# Altium footprint library soldeerstation.PcbLib: 91 footprints (part 4 of 6)
Each footprint in its own frame and in the unit in brackets; x right, y up, seen from the top. Pads: shape width x height; smd on the part's side, far side on the other; paste and mask are expansions set on the pad; w line width, h text height; cw(c..) or ccw(c..) is an arc to the next point about the centre after c.
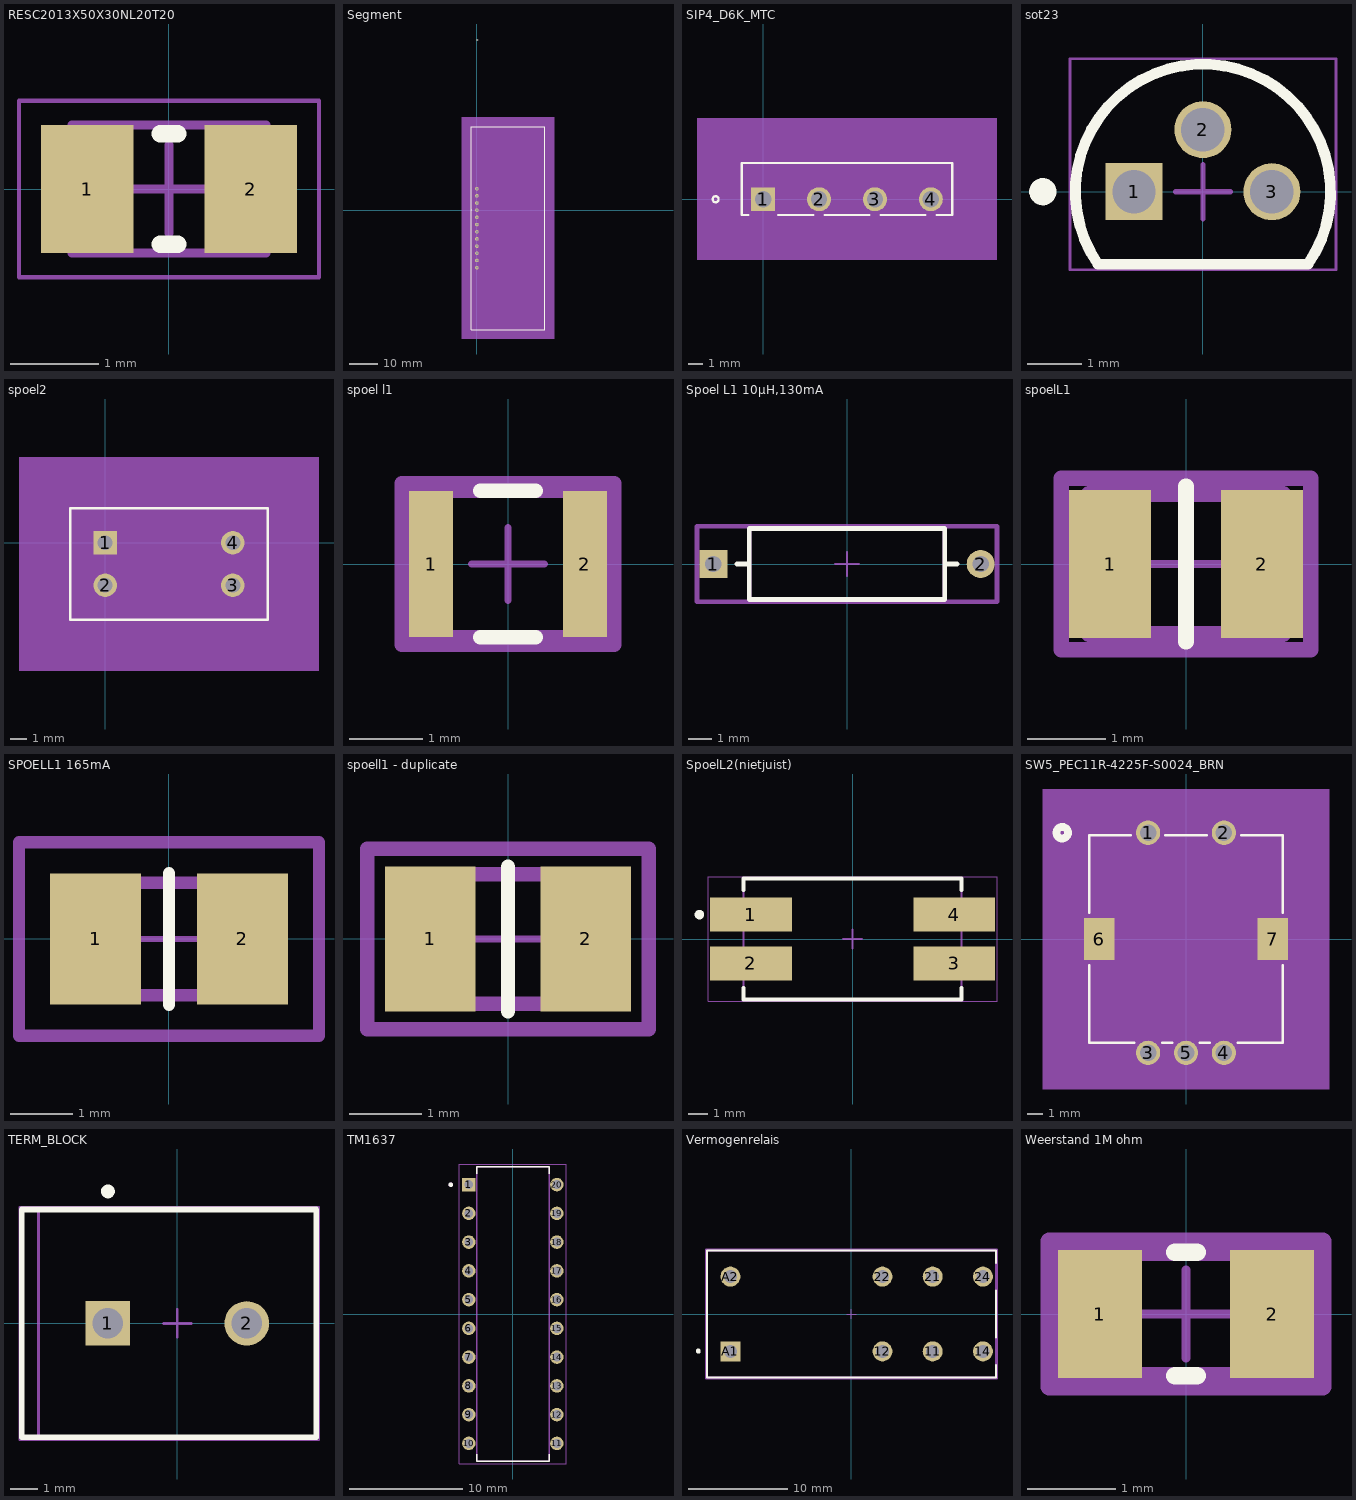
[diagram p3: the footprints below, top view; thin cyan lines are the x and y axes]

## RESC2013X50X30NL20T20 [mm] "Chip Resistor, 2-Leads, Body 2.00x1.25mm, IPC Medium Density"
height 0.5
pads (2):
  rect 1.05x1.45 smd: 1(-0.925,0) 2(0.925,0)
Top Overlay:
  lines w0.2: -0.1,-0.625 0.1,-0.625 ; -0.1,0.625 0.1,0.625
Mechanical 13:
  lines w0.1: -1.1,-0.725 -1.1,0.725 1.1,0.725 1.1,-0.725 -1.1,-0.725
Mechanical 15:
  lines w0.05: -1.7,-1 -1.7,1 1.7,1 1.7,-1 -1.7,-1
  lines w0.1: -0.5,0 0.5,0 ; 0,-0.5 0,0.5
3D body: height 0.5, standoff 0, extent -0.8,-0.725 0.8,0.725
3D body: height 0.5, standoff 0, extent -1.1,-0.725 -0.8,0.725
3D body: height 0.5, standoff 0, extent 0.8,-0.725 1.1,0.725

## Segment [mil]
pads (12):
  round 50 hole 30 mask+0: 1(0,0) 2(0,-100) 3(0,-200) 4(0,-300) 5(0,-400) 6(0,-500) 7(0,-800) 8(0,300) 9(0,-700) 10(0,200) 11(0,100) 12(0,-600)
Top Overlay:
  circle w6: c-79,0 r3
  lines w6: -77.93,-1664.55 -77.93,1164.45 944.07,1164.45 944.07,-1664.55 -77.93,-1664.55
  text "*" at -12.5,2335.56 h50
Top Assembly:
  region: 1074.07,-1794.55 -207.93,-1794.55 -207.93,1294.45 1074.07,1294.45
Mechanical 13:
  circle w0: c25,0 r3
  lines w0: 421.07,1159.45 ccw(c433.07,1159.45) 445.07,1159.45
  lines w1: -72.93,-1659.55 -72.93,1159.45 939.07,1159.45 939.07,-1659.55 -72.93,-1659.55
  text "*" at -12.5,16.67 h50
Mechanical 15:
  region: 939.07,-1659.55 -72.93,-1659.55 -72.93,1159.45 939.07,1159.45
  region: 949.07,-1669.55 -82.93,-1669.55 -82.93,1169.45 949.07,1169.45
  lines w6: -82.93,-1669.55 949.07,-1669.55 949.07,1169.45 -82.93,1169.45 -82.93,-1669.55
3D body "COM-11408_SPK.step": height 335.12, standoff -100, extent -72.91,-1659.57 939.06,1159.45

## SIP4_D6K_MTC [mil]
pads (4):
  rect 64x64 hole 44 mask+0: 1(0,0)
  round 64 hole 44 mask+0: 2(150,0) 3(300,0) 4(450,0)
Top Overlay:
  circle w6: c-127.5,0 r8
  lines w6: -39.86,-42.48 -57.5,-42.48 -57.5,97.52 507.5,97.52 507.5,-42.48 465.15,-42.48 ; 39.86,-42.48 134.85,-42.48 ; 165.15,-42.48 284.85,-42.48 ; 315.15,-42.48 434.85,-42.48
Top Assembly:
  region: -177.5,217.52 627.5,217.52 627.5,-162.48 -177.5,-162.48
Mechanical 13:
  circle w0: c-42.5,-27.48 r8
  lines w1: -52.5,-37.48 502.5,-37.48 502.5,92.52 -52.5,92.52 -52.5,-37.48
Mechanical 15:
  region: 512.5,102.52 -62.5,102.52 -62.5,-47.48 512.5,-47.48
  lines w6: -62.5,-47.48 -62.5,102.52 512.5,102.52 512.5,-47.48 -62.5,-47.48
3D body "SIP4_D6K_MTC.step": height 484.02, standoff -235.98, extent -52.52,-37.48 502.48,92.52

## sot23 [mm] "TO, 3-Leads, Body Dia 4.7mm, Pitch 1.27mm"
height 7.87
pads (3):
  rect 1.05x1.05 hole 0.8: 1(-1.27,0)
  round 1.05 hole 0.8: 2(0,1.143) 3(1.27,0)
Top Overlay:
  circle w0.25: c-2.95,0 r0.125
  lines w0.2: -1.934,-1.335 cw(c0,0) 1.934,-1.335 -1.934,-1.335
Mechanical 13:
  lines w0.1: -1.934,-1.335 cw(c0,0) 1.934,-1.335 -1.934,-1.335
Mechanical 15:
  lines w0.05: -2.45,-1.435 2.45,-1.435 2.45,2.45 -2.45,2.45 -2.45,-1.435
  lines w0.1: -0.5,0 0.5,0 ; 0,-0.5 0,0.5
3D body: height 7.87, standoff 2.54, extent -2.349,-1.334 2.357,2.359

## spoel2 [mil]
pads (4):
  rect 55x55 hole 35 mask+0: 1(0,0)
  round 55 hole 35 mask+0: 2(0,-100) 3(300,-100) 4(300,0)
Top Overlay:
  lines w6: -82.5,-181 -82.5,81 382.5,81 382.5,-181 -82.5,-181
Top Assembly:
  region: 502.5,-301 -202.5,-301 -202.5,201 502.5,201
Mechanical 13:
  lines w1: -77.5,-176 -77.5,76 377.5,76 377.5,-176 -77.5,-176
Mechanical 15:
  region: 387.5,-186 -87.5,-186 -87.5,86 387.5,86
  lines w6: -87.5,-186 387.5,-186 387.5,86 -87.5,86 -87.5,-186
3D body: height 10, standoff 0, extent 0,0 10,10

## spoel l1 [mm]
pads (2):
  rect 0.6x2 smd paste+0 mask+0: 1(-1.05,0) 2(1.05,0)
Top Overlay:
  lines w0.2: -0.375,-1 0.375,-1 ; -0.375,1 0.375,1
Top 3D Body:
  lines w0.2: -1.35,-1 -1.35,1 1.35,1 1.35,-1 -1.35,-1
Top Courtyard:
  lines w0.2: -1.45,-1.1 -1.45,1.1 1.45,1.1 1.45,-1.1 -1.45,-1.1
Top Assembly:
  lines w0.2: -1.45,-1.1 -1.45,1.1 1.45,1.1 1.45,-1.1 -1.45,-1.1
  text ".Designator" at 0,0.187 h1
Top Component Center:
  lines w0.1: -0.5,0 0.5,0 ; 0,-0.5 0,0.5
3D body "Ind_Taiyo_Yuden_LB2518T1R0M_eec.STEP": height 0.25, standoff 0, extent -1.45,-1.1 1.45,1.1

## Spoel L1 10µH,130mA [mm]
pads (2):
  rect 1.2x1.2 hole 0.7 paste-1000 mask+0: 1(-5.736,0)
  round 1.2 hole 0.7 paste-1000 mask+0: 2(5.736,0)
Top Overlay:
  lines w0.2: -4.736,0 -4.19,0 ; 4.19,0 4.736,0 ; -4.19,-1.525 4.19,-1.525 4.19,1.525 -4.19,1.525 -4.19,-1.525
Top 3D Body:
  lines w0.2: -4.19,-1.525 4.19,-1.525 4.19,1.525 -4.19,1.525 -4.19,-1.525
Top Courtyard:
  lines w0.2: -6.436,-1.625 6.436,-1.625 6.436,1.625 -6.436,1.625 -6.436,-1.625
Top Assembly:
  lines w0.2: -6.436,-1.625 6.436,-1.625 6.436,1.625 -6.436,1.625 -6.436,-1.625
  text ".Designator" at 0,0.187 h1
Top Component Center:
  lines w0.1: -0.5,0 0.5,0 ; 0,-0.5 0,0.5
3D body "Ind_Vishay_Dale_IR02BH100K_eec.STEP": height 0.25, standoff 0, extent -6.436,-1.625 6.436,1.625

## spoelL1 [mm]
pads (2):
  rect 1.055x1.906 smd paste+0 mask+0: 1(-0.976,0) 2(0.976,0)
Top Overlay:
  lines w0.2: 0,-1 0,1
Top 3D Body:
  lines w0.2: -1.25,-0.9 -1.25,0.9 1.25,0.9 1.25,-0.9 -1.25,-0.9
Top Courtyard:
  lines w0.2: -1.603,-1.1 -1.603,1.1 1.603,1.1 1.603,-1.1 -1.603,-1.1
Top Assembly:
  lines w0.2: -1.603,-1.1 -1.603,1.1 1.603,1.1 1.603,-1.1 -1.603,-1.1
  text ".Designator" at 0,-0.001 h1
Top Component Center:
  lines w0.1: -0.5,0 0.5,0 ; 0,-0.5 0,0.5
3D body "Ind_Taiyo_Yuden_LB2518T1R0M_eec.STEP": height 0.25, standoff 0, extent -1.603,-1.1 1.603,1.1

## SPOELL1 165mA [mm]
pads (2):
  rect 1.455x2.106 smd paste+0 mask+0: 1(-1.176,0) 2(1.176,0)
Top Overlay:
  lines w0.2: 0,-1.053 0,1.053
Top 3D Body:
  lines w0.2: -1.25,-0.9 1.25,-0.9 1.25,0.9 -1.25,0.9 -1.25,-0.9
Top Courtyard:
  lines w0.2: -2.403,-1.553 2.403,-1.553 2.403,1.553 -2.403,1.553 -2.403,-1.553
Top Assembly:
  lines w0.2: -2.403,-1.553 2.403,-1.553 2.403,1.553 -2.403,1.553 -2.403,-1.553
  text ".Designator" at 0,-0.001 h1
Top Component Center:
  lines w0.1: -0.5,0 0.5,0 ; 0,-0.5 0,0.5
3D body "Ind_Taiyo_Yuden_LB2518T1R0M_eec.STEP": height 0.25, standoff 0, extent -2.403,-1.553 2.403,1.553

## spoell1 - duplicate [mm]
pads (2):
  rect 1.255x2.006 smd paste+0 mask+0: 1(-1.076,0) 2(1.076,0)
Top Overlay:
  lines w0.2: 0,-1.003 0,1.003
Top 3D Body:
  lines w0.2: -1.25,-0.9 1.25,-0.9 1.25,0.9 -1.25,0.9 -1.25,-0.9
Top Courtyard:
  lines w0.2: -1.953,-1.253 1.953,-1.253 1.953,1.253 -1.953,1.253 -1.953,-1.253
Top Assembly:
  lines w0.2: -1.953,-1.253 1.953,-1.253 1.953,1.253 -1.953,1.253 -1.953,-1.253
  text ".Designator" at 0,-0.001 h1
Top Component Center:
  lines w0.1: -0.5,0 0.5,0 ; 0,-0.5 0,0.5
3D body "Ind_Taiyo_Yuden_LB2518T1R0M_eec.STEP": height 0.25, standoff 0, extent -1.953,-1.253 1.953,1.253

## SpoelL2(nietjuist) [mm] "SMD, 4-Leads, Body 11.38x6.3mm"
height 10.16
pads (4):
  rect 4.27x1.78 smd: 1(-5.305,1.27) 2(-5.305,-1.27) 3(5.305,-1.27) 4(5.305,1.27)
Top Overlay:
  circle w0.25: c-7.99,1.27 r0.125
  lines w0.2: -5.69,-2.56 -5.69,-3.15 5.69,-3.15 5.69,-2.56 ; -5.69,2.56 -5.69,3.15 5.69,3.15 5.69,2.56
Mechanical 13:
  lines w0.1: -5.69,-3.15 -5.69,3.15 5.69,3.15 5.69,-3.15 -5.69,-3.15
Mechanical 15:
  lines w0.05: -7.54,-3.25 7.54,-3.25 7.54,3.25 -7.54,3.25 -7.54,-3.25
  lines w0.1: -0.5,0 0.5,0 ; 0,-0.5 0,0.5
3D body: height 10.16, standoff 0, extent -5.69,-3.15 5.69,3.15

## SW5_PEC11R-4225F-S0024_BRN [mil]
pads (7):
  round 63 hole 43 unplated: 1(-98.43,275.59) 2(98.43,275.59) 3(-98.43,-295.28) 4(98.43,-295.28) 5(0,-295.28)
  rect 79x109 smd: 6(-224.41,0) 7(224.41,0)
Top Overlay:
  circle w20: c-321,275.59 r15
  lines w6: -251,-67.6 -251,-269 -134.46,-269 ; -251,67.6 -251,269 -142.54,269 ; -62.39,-269 -36.04,-269 ; -54.31,269 54.31,269 ; 36.04,-269 62.39,-269 ; 134.46,-269 251,-269 251,-67.6 ; 142.54,269 251,269 251,67.6
Bottom Overlay:
  circle w20: c-321,275.59 r15
Top Assembly:
  region: -371,389 371,389 371,-389 -371,-389
Mechanical 13:
  circle w20: c-98.43,350.59 r15
  lines w1: -246,-264 -246,264 246,264 246,-264 -246,-264
Mechanical 15:
  region: 273.91,317.09 -273.91,317.09 -273.91,-336.78 273.91,-336.78
  lines w6: -273.91,-336.78 273.91,-336.78 273.91,317.09 -273.91,317.09 -273.91,-336.78
3D body: height 10, standoff 0, extent 0,0 10,10

## TERM_BLOCK [mm] "Female Header, Pitch 5mm, 1 x 2 Position, Height 10mm"
height 10
pads (2):
  rect 1.6x1.6 hole 1.1: 1(-2.5,0)
  round 1.6 hole 1.1: 2(2.5,0)
Top Overlay:
  circle w0.25: c-2.5,4.75 r0.125
  lines w0.2: -5.6,-4.1 5,-4.1 5,4.1 -5.6,4.1 -5.6,-4.1
Mechanical 13:
  lines w0.1: -5,-4.1 -5,4.1 5,4.1 5,-4.1 -5,-4.1
Mechanical 15:
  lines w0.05: -5.7,-4.2 -5.7,4.2 5.1,4.2 5.1,-4.2 -5.7,-4.2
  lines w0.1: -0.5,0 0.5,0 ; 0,-0.5 0,0.5
3D body: height 0.25, standoff 0, extent -5.6,-4.1 5,4.1

## TM1637 [mm]
pads (20):
  rect 1.19x1.19 hole 0.79: 1(-3.89,11.43)
  round 1.19 hole 0.79: 2(-3.89,8.89) 3(-3.89,6.35) 4(-3.89,3.81) 5(-3.89,1.27) 6(-3.89,-1.27) 7(-3.89,-3.81) 8(-3.89,-6.35) 9(-3.89,-8.89) 10(-3.89,-11.43) 11(3.89,-11.43) 12(3.89,-8.89) 13(3.89,-6.35) 14(3.89,-3.81) 15(3.89,-1.27) 16(3.89,1.27) 17(3.89,3.81) 18(3.89,6.35) 19(3.89,8.89) 20(3.89,11.43)
Top Overlay:
  circle w0.2: c-5.485,11.43 r0.1
  lines w0.127: -3.2,-12.375 -3.2,-13 3.2,-13 3.2,-12.375 ; -3.2,12.375 -3.2,13 3.2,13 3.2,12.375
Mechanical 13:
  circle w0.2: c-5.485,11.43 r0.1
  lines w0.127: -3.2,-13 3.2,-13 3.2,13 -3.2,13 -3.2,-13
Mechanical 15:
  lines w0.05: -4.735,-13.25 -4.735,13.25 4.735,13.25 4.735,-13.25 -4.735,-13.25
3D body "step_temp.STEP": height 4.31, standoff -3.6, extent -4.03,-13 4.03,13

## Vermogenrelais [mm]
pads (8):
  round 2 hole 1.3 paste-1000 mask+0: 11(8.15,-3.75) 12(3.11,-3.75) 14(13.19,-3.75) 21(8.15,3.75) 22(3.11,3.75) 24(13.19,3.75) A2(-12.15,3.75)
  rect 2x2 hole 1.3 paste-1000 mask+0: A1(-12.15,-3.75)
Top Overlay:
  circle w0.25: c-15.375,-3.725 r0.125
  lines w0.2: 14.5,-5.125 14.5,-6.35 -14.5,-6.35 -14.5,6.35 14.5,6.35 14.5,5.125 ; 14.5,-2.375 14.5,2.375
Top 3D Body:
  lines w0.2: -14.5,-6.35 -14.5,6.35 14.5,6.35 14.5,-6.35 -14.5,-6.35
Top Courtyard:
  lines w0.2: -14.6,-6.45 -14.6,6.45 14.6,6.45 14.6,-6.45 -14.6,-6.45
Top Assembly:
  lines w0.2: -14.6,-6.45 -14.6,6.45 14.6,6.45 14.6,-6.45 -14.6,-6.45
  text ".Designator" at 0,0.187 h1
Top Component Center:
  lines w0.1: -0.5,0 0.5,0 ; 0,-0.5 0,0.5
3D body "Relay_TE_Connectivity_RT424005_eec.STEP": height 0.25, standoff 0, extent -14.6,-6.45 14.6,6.45

## Weerstand 1M ohm [mm]
pads (2):
  rect 0.95x1.45 smd paste+0 mask+0: 1(-0.975,0) 2(0.975,0)
Top Overlay:
  lines w0.2: -0.125,-0.7 0.125,-0.7 ; -0.125,0.7 0.125,0.7
Top 3D Body:
  lines w0.2: -1.1,-0.7 -1.1,0.7 1.1,0.7 1.1,-0.7 -1.1,-0.7
Top Courtyard:
  lines w0.2: -1.55,-0.825 -1.55,0.825 1.55,0.825 1.55,-0.825 -1.55,-0.825
Top Assembly:
  lines w0.2: -1.55,-0.825 -1.55,0.825 1.55,0.825 1.55,-0.825 -1.55,-0.825
  text ".Designator" at 0,0.187 h1
Top Component Center:
  lines w0.1: -0.5,0 0.5,0 ; 0,-0.5 0,0.5
3D body "Res_Vishay_CRCW0805100KFKEA_eec.STEP": height 0.25, standoff 0, extent -1.55,-0.825 1.55,0.825